# Altium footprint library Connectors.PcbLib: 117 footprints (part 7 of 8)
Each footprint in its own frame and in the unit in brackets; x right, y up, seen from the top. Pads: shape width x height; smd on the part's side, far side on the other; paste and mask are expansions set on the pad; w line width, h text height; cw(c..) or ccw(c..) is an arc to the next point about the centre after c.
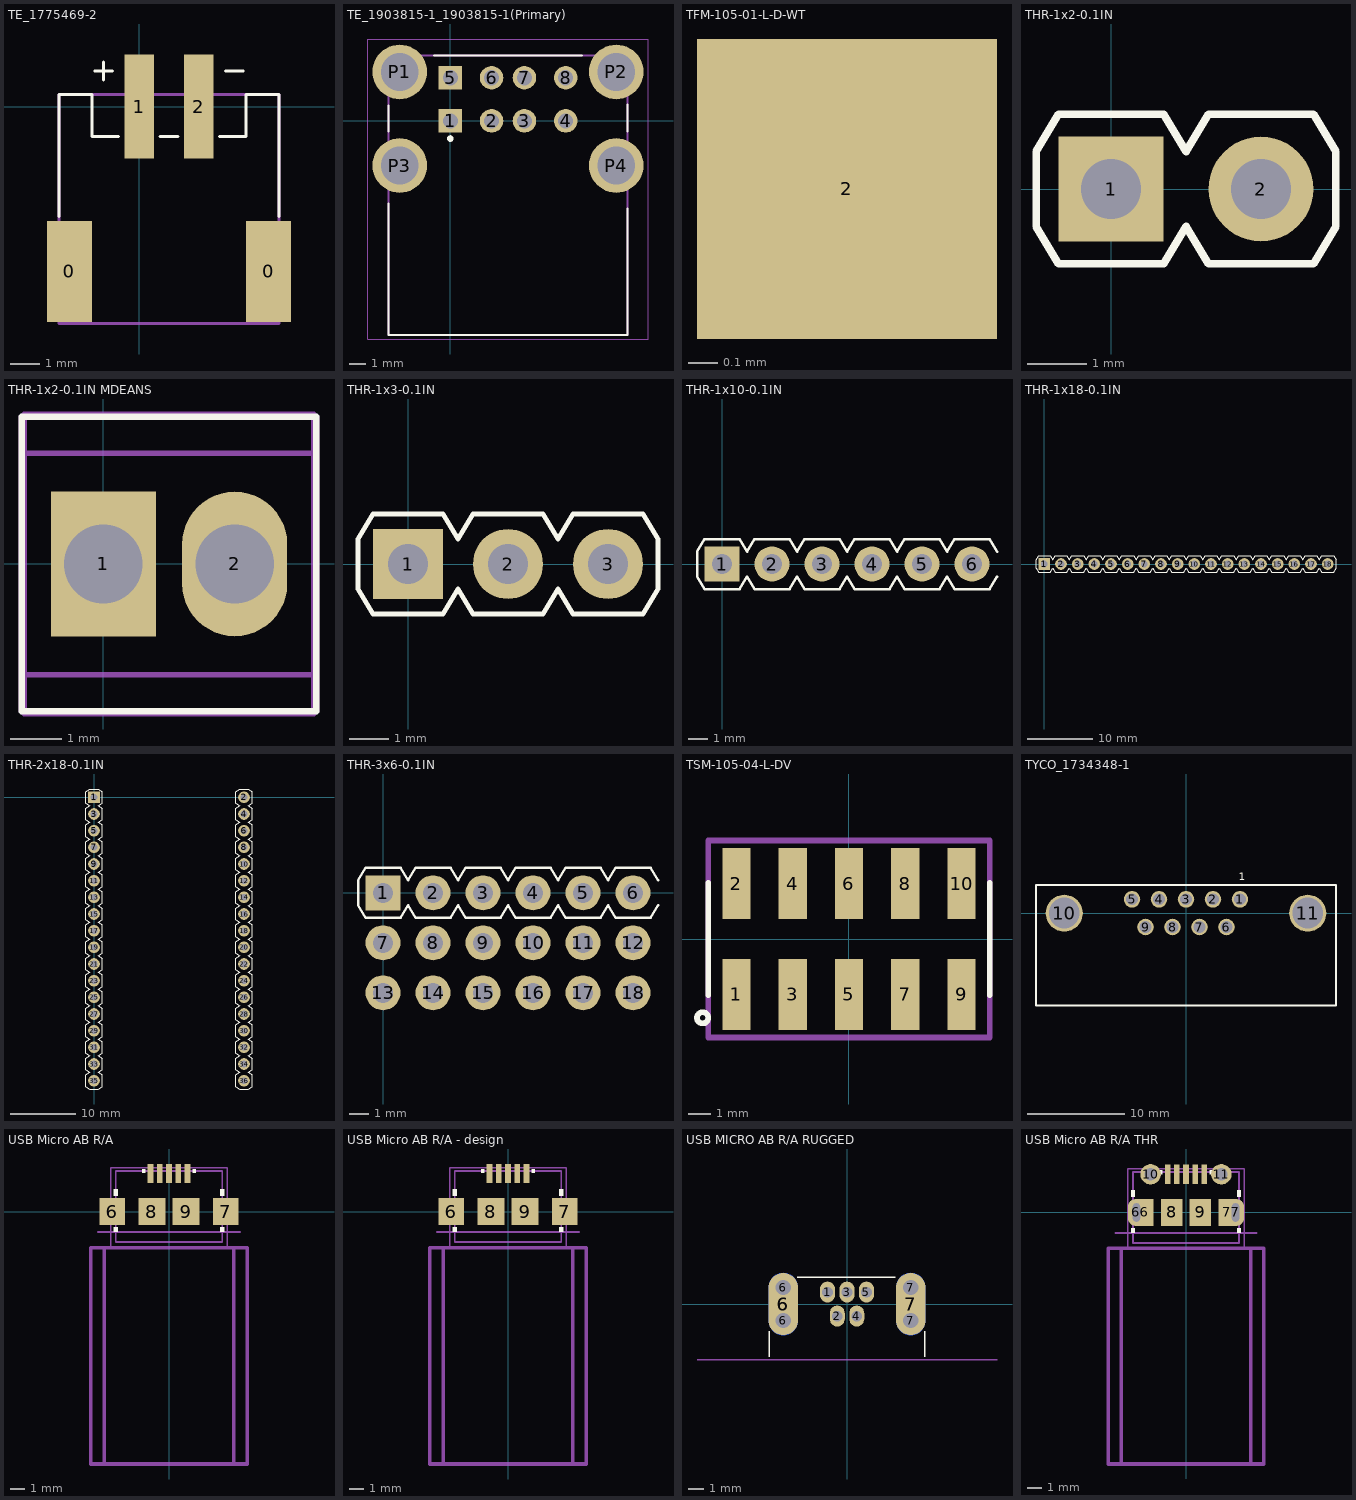
[diagram p6: the footprints below, top view; thin cyan lines are the x and y axes]

## TE_1775469-2 [mm] "CONN HEADER 2POS 2MM R/A SMD"
height 5.5
pads (4):
  rect 1.5x3.4 smd: 0(-2.35,-5.55) 0(4.35,-5.55)
  rect 1x3.5 smd: 1(0,0) 2(2,0)
Top Overlay:
  lines w0.1: -2.7,-3.7 -2.7,0.4 -1.6,0.4 -1.6,-1 -0.7,-1 ; -1.5,1.2 -0.9,1.2 ; -1.2,0.9 -1.2,1.5 ; 0.7,-1 1.3,-1 ; 2.7,-1 3.6,-1 3.6,0.4 4.7,0.4 4.7,-3.7 ; 2.9,1.2 3.5,1.2
Mechanical 15:
  lines w0.1: -2.7,-7.3 4.7,-7.3 4.7,0.4 -2.7,0.4 -2.7,-7.3
3D body "c-1775469-2-a-3d.stp": height 5.6, standoff 0, extent -2.7,-7.2 4.7,1.4

## TE_1903815-1_1903815-1(Primary) [mm]
pads (12):
  rect 1.428x1.428 hole 0.92: 1(0,0) 5(0,2.62)
  round 1.428 hole 0.92: 2(2.5,0) 3(4.5,0) 4(7,0) 6(2.5,2.62) 7(4.5,2.62) 8(7,2.62)
  round 3.316 hole 2.3: P1(-3.07,2.97) P2(10.07,2.97) P3(-3.07,-2.71) P4(10.07,-2.71)
Top Overlay:
  circle w0.2: c0,-1.072 r0.1
  lines w0.127: -3.75,-5.03 -3.75,-12.99 10.75,-12.99 10.75,-5.33 ; -3.75,-0.63 -3.75,0.93 ; -1,3.97 8,3.97 ; 10.75,-0.63 10.75,1
Mechanical 1:
  lines w0.127: -3.75,-12.99 -3.75,3.97 10.75,3.97 10.75,-12.99 -3.75,-12.99
Mechanical 4:
  lines w0.05: -5,-13.24 12,-13.24 12,4.97 -5,4.97 -5,-13.24
3D body "c-1903815-1-b-3d.stp": height 16.21, standoff -3.71, extent -4.299,-13 11.299,3.96

## TFM-105-01-L-D-WT [mm] "HEADER 10POS 1.27MM THRUHOLE"
height 5.62
pads (1):
  rect 1x1 smd paste+0 mask+0: 2(4.85,-4.9)
3D body "TFM-105-01-L-D-WT.stp": height 2.36, standoff -3.35, extent -1.391,-5.762 11.639,2.188

## THR-1x2-0.1IN [mil] "Through Hold 0.1 Inch Pitch Header"
pads (2):
  rect 70x70 hole 40: 1(0,0)
  round 70 hole 40: 2(100,0)
Top Overlay:
  lines w5: -50,-25 -35,-50 0,-50 35,-50 50,-25 65,-50 135,-50 150,-25 150,25 135,50 65,50 50,25 35,50 0,50 -35,50 -50,25 -50,-25

## THR-1x2-0.1IN MDEANS [mil] "Through Hold 0.1 Inch Pitch Header - Mini Deans"
pads (2):
  rect 80x110 hole 60: 1(0,0)
  oval 80x110 hole 60: 2(100,0)
Top Overlay:
  lines w5: -62.2,-112.2 -62.2,112.2 162.2,112.2 162.2,-112.2 -62.2,-112.2
Mechanical 13:
  lines w3.94: -60.24,114.17 -60.24,114.17 ; -60.24,114.17 -60.24,-114.18 160.23,-114.18 160.24,-114.17 160.24,114.17 -60.24,114.17 ; -60.24,-84.25 -60.24,84.25 160.24,84.25 160.24,-84.25 -60.24,-84.25
  lines w5: -62.2,-112.2 162.2,-112.2 162.2,112.2 -62.2,112.2 -62.2,-112.2
3D body: height 285.43, standoff 238.19, extent -60.24,-116.15 160.24,116.14
3D body: height 285.43, standoff 0, extent -60.22,-84.23 160.22,84.23

## THR-1x3-0.1IN [mil] "Through Hold 0.1 Inch Pitch Header"
pads (3):
  rect 70x70 hole 40: 1(0,0)
  round 70 hole 40: 2(100,0) 3(200,0)
Top Overlay:
  lines w5: -50,-25 -50,25 -35,50 0,50 35,50 50,25 65,50 135,50 150,25 165,50 235,50 250,25 250,-25 235,-50 165,-50 150,-25 135,-50 65,-50 50,-25 35,-50 0,-50 -35,-50 -50,-25
3D body "User Library-PinHeaderX3.STEP": height 335.52, standoff -144.4, extent -49.63,-60.1 250.37,54.86

## THR-1x10-0.1IN [mil] "Through Hold 0.1 Inch Pitch Header"
pads (6):
  rect 70x70 hole 40: 1(0,0)
  round 70 hole 40: 2(100,0) 3(200,0) 4(300,0) 5(400,0) 6(500,0)
Top Overlay:
  lines w5: 550,-25 535,-50 465,-50 450,-25 435,-50 365,-50 350,-25 335,-50 265,-50 250,-25 235,-50 165,-50 150,-25 135,-50 65,-50 50,-25 35,-50 0,-50 -35,-50 -50,-25 -50,25 -35,50 0,50 35,50 50,25 65,50 135,50 150,25 165,50 235,50 250,25 265,50 335,50 350,25 365,50 435,50 450,25 465,50 535,50 550,25

## THR-1x18-0.1IN [mil] "Through Hold 0.1 Inch Pitch Header"
pads (18):
  rect 70x70 hole 40: 1(0,0)
  round 70 hole 40: 2(100,0) 3(200,0) 4(300,0) 5(400,0) 6(500,0) 7(600,0) 8(700,0) 9(800,0) 10(900,0) 11(1000,0) 12(1100,0) 13(1200,0) 14(1300,0) 15(1400,0) 16(1500,0) 17(1600,0) 18(1700,0)
Top Overlay:
  lines w5: -50,-25 -50,25 -35,50 0,50 35,50 50,25 65,50 135,50 150,25 165,50 235,50 250,25 265,50 335,50 350,25 365,50 435,50 450,25 465,50 535,50 550,25 565,50 635,50 650,25 665,50 735,50 750,25 765,50 835,50 850,25 865,50 935,50 950,25 965,50 1035,50 1050,25 1065,50 1135,50 1150,25 1165,50 1235,50 1250,25 1265,50 1335,50 1350,25 1365,50 1435,50 1450,25 1465,50 1535,50 1550,25 1565,50 1635,50 1650,25 1665,50 1735,50 1750,25 1750,-25 1735,-50 1665,-50 1650,-25 1635,-50 1565,-50 1550,-25 1535,-50 1465,-50 1450,-25 1435,-50 1365,-50 1350,-25 1335,-50 1265,-50 1250,-25 1235,-50 1165,-50 1150,-25 1135,-50 1065,-50 1050,-25 1035,-50 965,-50 950,-25 935,-50 865,-50 850,-25 835,-50 765,-50 750,-25 735,-50 665,-50 650,-25 635,-50 565,-50 550,-25 535,-50 465,-50 450,-25 435,-50 365,-50 350,-25 335,-50 265,-50 250,-25 235,-50 165,-50 150,-25 135,-50 65,-50 50,-25 35,-50 0,-50 -35,-50 -50,-25

## THR-2x18-0.1IN [mil] "Through Hold 0.1 Inch Pitch Header"
pads (36):
  rect 70x70 hole 40: 1(0,0)
  round 70 hole 40: 2(900,0) 3(0,-100) 4(900,-100) 5(0,-200) 6(900,-200) 7(0,-300) 8(900,-300) 9(0,-400) 10(900,-400) 11(0,-500) 12(900,-500) 13(0,-600) 14(900,-600) 15(0,-700) 16(900,-700) 17(0,-800) 18(900,-800) 19(0,-900) 20(900,-900) 21(0,-1000) 22(900,-1000) 23(0,-1100) 24(900,-1100) 25(0,-1200) 26(900,-1200) 27(0,-1300) 28(900,-1300) 29(0,-1400) 30(900,-1400) 31(0,-1500) 32(900,-1500) 33(0,-1600) 34(900,-1600) 35(0,-1700) 36(900,-1700)
Top Overlay:
  drawing of 224 lines, arcs and shapes, not listed

## THR-3x6-0.1IN [mil] "Through Hold 0.1 Inch Pitch Header"
pads (18):
  rect 70x70 hole 40: 1(0,0)
  round 70 hole 40: 2(100,0) 3(200,0) 4(300,0) 5(400,0) 6(500,0) 7(0,-100) 8(100,-100) 9(200,-100) 10(300,-100) 11(400,-100) 12(500,-100) 13(0,-200) 14(100,-200) 15(200,-200) 16(300,-200) 17(400,-200) 18(500,-200)
Top Overlay:
  lines w5: 550,-25 535,-50 465,-50 450,-25 435,-50 365,-50 350,-25 335,-50 265,-50 250,-25 235,-50 165,-50 150,-25 135,-50 65,-50 50,-25 35,-50 0,-50 -35,-50 -50,-25 -50,25 -35,50 0,50 35,50 50,25 65,50 135,50 150,25 165,50 235,50 250,25 265,50 335,50 350,25 365,50 435,50 450,25 465,50 535,50 550,25
3D body "TSW-104-07-X-T.step": height 330, standoff -100, extent -50,-250 350,50

## TSM-105-04-L-DV [mm] "Samtec 5x2 2.54mm Header"
pads (10):
  rect 1.27x3.2 smd: 1(-5.08,-2.5) 2(-5.08,2.5) 3(-2.54,-2.5) 4(-2.54,2.5) 5(0,-2.5) 6(0,2.5) 7(2.54,-2.5) 8(2.54,2.5) 9(5.08,-2.5) 10(5.08,2.5)
Top Overlay:
  circle w0.254: c-6.604,-3.556 r0.254
  lines w0.254: -6.35,-2.54 -6.35,2.54 ; 6.35,-2.54 6.35,2.54
Mechanical 15:
  lines w0.254: -6.35,-4.445 -6.35,4.445 6.35,4.445 6.35,-4.445 -6.35,-4.445
3D body "TSM-105-04-L-DV.stp": height 6.86, standoff 0, extent -6.35,-3.848 6.35,3.848

## TYCO_1734348-1 [mm]
pads (11):
  round 1.7 hole 1.2: 1(5.54,1.42) 2(2.77,1.42) 3(0,1.42) 4(-2.77,1.42) 5(-5.54,1.42) 6(4.155,-1.42) 7(1.385,-1.42) 8(-1.385,-1.42) 9(-4.155,-1.42)
  round 3.8 hole 3.18: 10(-12.5,0) 11(12.5,0)
Top Overlay:
  lines w0.203: -15.4,-9.5 15.4,-9.5 15.4,2.9 -15.4,2.9 -15.4,-9.5
  text "1" at 5.4,3.4 h0.8
3D body "c-1734348-1-b-3d.stp": height 12.52, standoff -4.08, extent -15.4,-15.539 15.4,2.881

## USB Micro AB R/A [mm] "USB Micro AB R/A Surface Mount"
height 2.8
pads (9):
  rect 0.4x1.35 smd: 1(-1.3,2.675) 2(-0.65,2.675) 3(0,2.675) 4(0.65,2.675) 5(1.3,2.675)
  rect 1.8x1.9 smd: 6(-4,0) 7(4,0)
  rect 1.9x1.9 smd: 8(-1.2,0) 9(1.2,0)
Top Overlay:
  region: 1.9,3 1.65,3 1.65,2.7 1.9,2.7
  region: -1.65,3 -1.9,3 -1.9,2.7 -1.65,2.7
  rectangle: -3.9,1.1 -3.6,1.6
  rectangle: 3.6,1.1 3.9,1.6
  region: -3.6,-1.1 -3.9,-1.1 -3.9,-1.45 -3.6,-1.45
  region: 3.9,-1.1 3.6,-1.1 3.6,-1.45 3.9,-1.45
Mechanical 13:
  lines w0.1: -4.1,-2.5 4.1,-2.5
  lines w0.127: -5,-1.45 5,-1.45 ; -3.75,-2.15 -3.75,2.85 3.75,2.85 3.75,-2.15 -3.75,-2.15
  lines w0.254: -5.5,-17.78 -5.5,-2.54 5.5,-2.54 5.5,-17.78 -5.5,-17.78 ; -4.572,-17.78 -4.572,-2.54 4.572,-2.54 4.572,-17.78 -4.572,-17.78
Mechanical 15:
  lines w0.1: -4.1,-2.5 -4.1,3.1 4.1,3.1 4.1,-2.5
3D body "User Library-MicroAB.STEP": height 2.78, standoff -0.22, extent -4.4,-2.725 4.4,2.875

## USB Micro AB R/A - design [mm] "USB Micro AB R/A Surface Mount"
height 2.8
pads (9):
  rect 0.4x1.35 smd: 1(-1.3,2.675) 2(-0.65,2.675) 3(0,2.675) 4(0.65,2.675) 5(1.3,2.675)
  rect 1.8x1.9 smd: 6(-4,0) 7(4,0)
  rect 1.9x1.9 smd: 8(-1.2,0) 9(1.2,0)
Top Overlay:
  region: 1.9,3 1.65,3 1.65,2.7 1.9,2.7
  region: -1.65,3 -1.9,3 -1.9,2.7 -1.65,2.7
  rectangle: -3.9,1.1 -3.6,1.6
  rectangle: 3.6,1.1 3.9,1.6
  region: -3.6,-1.1 -3.9,-1.1 -3.9,-1.45 -3.6,-1.45
  region: 3.9,-1.1 3.6,-1.1 3.6,-1.45 3.9,-1.45
Mechanical 13:
  lines w0.1: -4.1,-2.5 4.1,-2.5
  lines w0.127: -5,-1.45 5,-1.45 ; -3.75,-2.15 -3.75,2.85 3.75,2.85 3.75,-2.15 -3.75,-2.15
  lines w0.254: -5.5,-17.78 -5.5,-2.54 5.5,-2.54 5.5,-17.78 -5.5,-17.78 ; -4.572,-17.78 -4.572,-2.54 4.572,-2.54 4.572,-17.78 -4.572,-17.78
Mechanical 15:
  lines w0.1: -4.1,-2.5 -4.1,3.1 4.1,3.1 4.1,-2.5
3D body "User Library-MicroAB.STEP": height 2.78, standoff -0.22, extent -4.4,-2.725 4.4,2.875
3D body "USBFIREWIRE_COM-MCBS.step": height 5.28, standoff -2.72, extent -6,-28.555 6,1.045

## USB MICRO AB R/A RUGGED [mm] "USB - micro AB USB 2.0 Receptacle Connector 5 Position Panel Mount, Through Hole, Right Angle"
pads (13):
  rrect100% 1x1.4 hole 0.7: 1(-1.3,0.8) 2(-0.65,-0.8) 3(0,0.8) 4(0.65,-0.8) 5(1.3,0.8)
  round 1.016 hole 1.016: 6(-4.25,-1.1) 6(-4.25,1.1) 7(4.25,-1.1) 7(4.25,1.1)
  oval 1.95x4.15 smd: 6(-4.25,0) 7(4.25,0)
  oval 1.95x4.15 smd far side: 6(-4.25,0) 7(4.25,0)
Top Overlay:
  lines w0.1: -5.2,-3.5 -5.2,-1.8 ; -3.3,1.8 3.2,1.8 ; 5.2,-3.5 5.2,-1.8
Mechanical 1:
  lines w0.1: -4.75,-1.575 -4.75,0.051 -4.75,1.575 -3.734,1.575 -3.734,-1.575 -4.75,-1.575 ; 3.75,-1.575 4.766,-1.575 4.766,1.575 3.75,1.575 3.75,0.051 3.75,-1.067 3.75,-1.575
Mechanical 13:
  lines w0.1: -10,-3.7 10,-3.7
3D body "M-MUSB-K152-30-REVT3.STEP": height 8.5, standoff -2.75, extent -10,-8.7 10,1.83

## USB Micro AB R/A THR [mm] "USB Micro AB R/A Through Hole"
height 2.8
pads (13):
  rect 0.4x1.35 smd: 1(-1.3,2.7) 2(-0.65,2.7) 3(0,2.7) 4(0.65,2.7) 5(1.3,2.7)
  rrect90% 1.2x1.9 hole 0.5 slot 1.3 at 90 deg paste+0: 6(-3.5,0)
  rect 1.2x1.9 smd: 6(-2.9,0) 7(2.9,0)
  rrect90% 1.2x1.9 hole 0.5 slot 1.3 at 90 deg: 7(3.5,0)
  rect 1.5x1.9 smd: 8(-1,0) 9(1,0)
  round 1.45 hole 0.85 mask+0.102: 10(-2.5,2.7) 11(2.5,2.7)
Top Overlay:
  region: 3.9,-1.1 3.6,-1.1 3.6,-1.45 3.9,-1.45
  region: -3.6,-1.1 -3.9,-1.1 -3.9,-1.45 -3.6,-1.45
  rectangle: 3.6,1.1 3.9,1.6
  rectangle: -3.9,1.1 -3.6,1.6
  region: -1.65,3 -1.9,3 -1.9,2.7 -1.65,2.7
  region: 1.9,3 1.65,3 1.65,2.7 1.9,2.7
Top Paste:
  circle w0.7: c3.55,-0.4 r0.2
  circle w0.7: c3.55,0.4 r0.2
  circle w0.7: c-3.55,-0.4 r0.2
  circle w0.7: c-3.55,0.4 r0.2
  circle w0.7: c-2.5,2.7 r0.35
  circle w0.7: c2.5,2.7 r0.35
  region: 4.1,0.4 3.35,0.4 3.35,-0.45 4.1,-0.45
  rectangle: -4.1,-0.4 -3.35,0.45
Mechanical 13:
  lines w0.1: -4.1,-2.5 4.1,-2.5
  lines w0.127: -5,-1.45 5,-1.45 ; -3.75,-2.15 3.75,-2.15 3.75,2.85 -3.75,2.85 -3.75,-2.15
  lines w0.254: -5.5,-17.78 5.5,-17.78 5.5,-2.54 -5.5,-2.54 -5.5,-17.78 ; -4.572,-17.78 4.572,-17.78 4.572,-2.54 -4.572,-2.54 -4.572,-17.78
Mechanical 15:
  lines w0.1: -4.1,-2.5 -4.1,3.1 4.1,3.1 4.1,-2.5
3D body "10118194c.step": height 2.69, standoff -0.59, extent -4.025,-2.655 4.025,2.925